# Altium footprint library BARKO_PCBLIB.PcbLib: 531 footprints (part 28 of 34)
Each footprint in its own frame and in the unit in brackets; x right, y up, seen from the top. Pads: shape width x height; smd on the part's side, far side on the other; paste and mask are expansions set on the pad; w line width, h text height; cw(c..) or ccw(c..) is an arc to the next point about the centre after c.
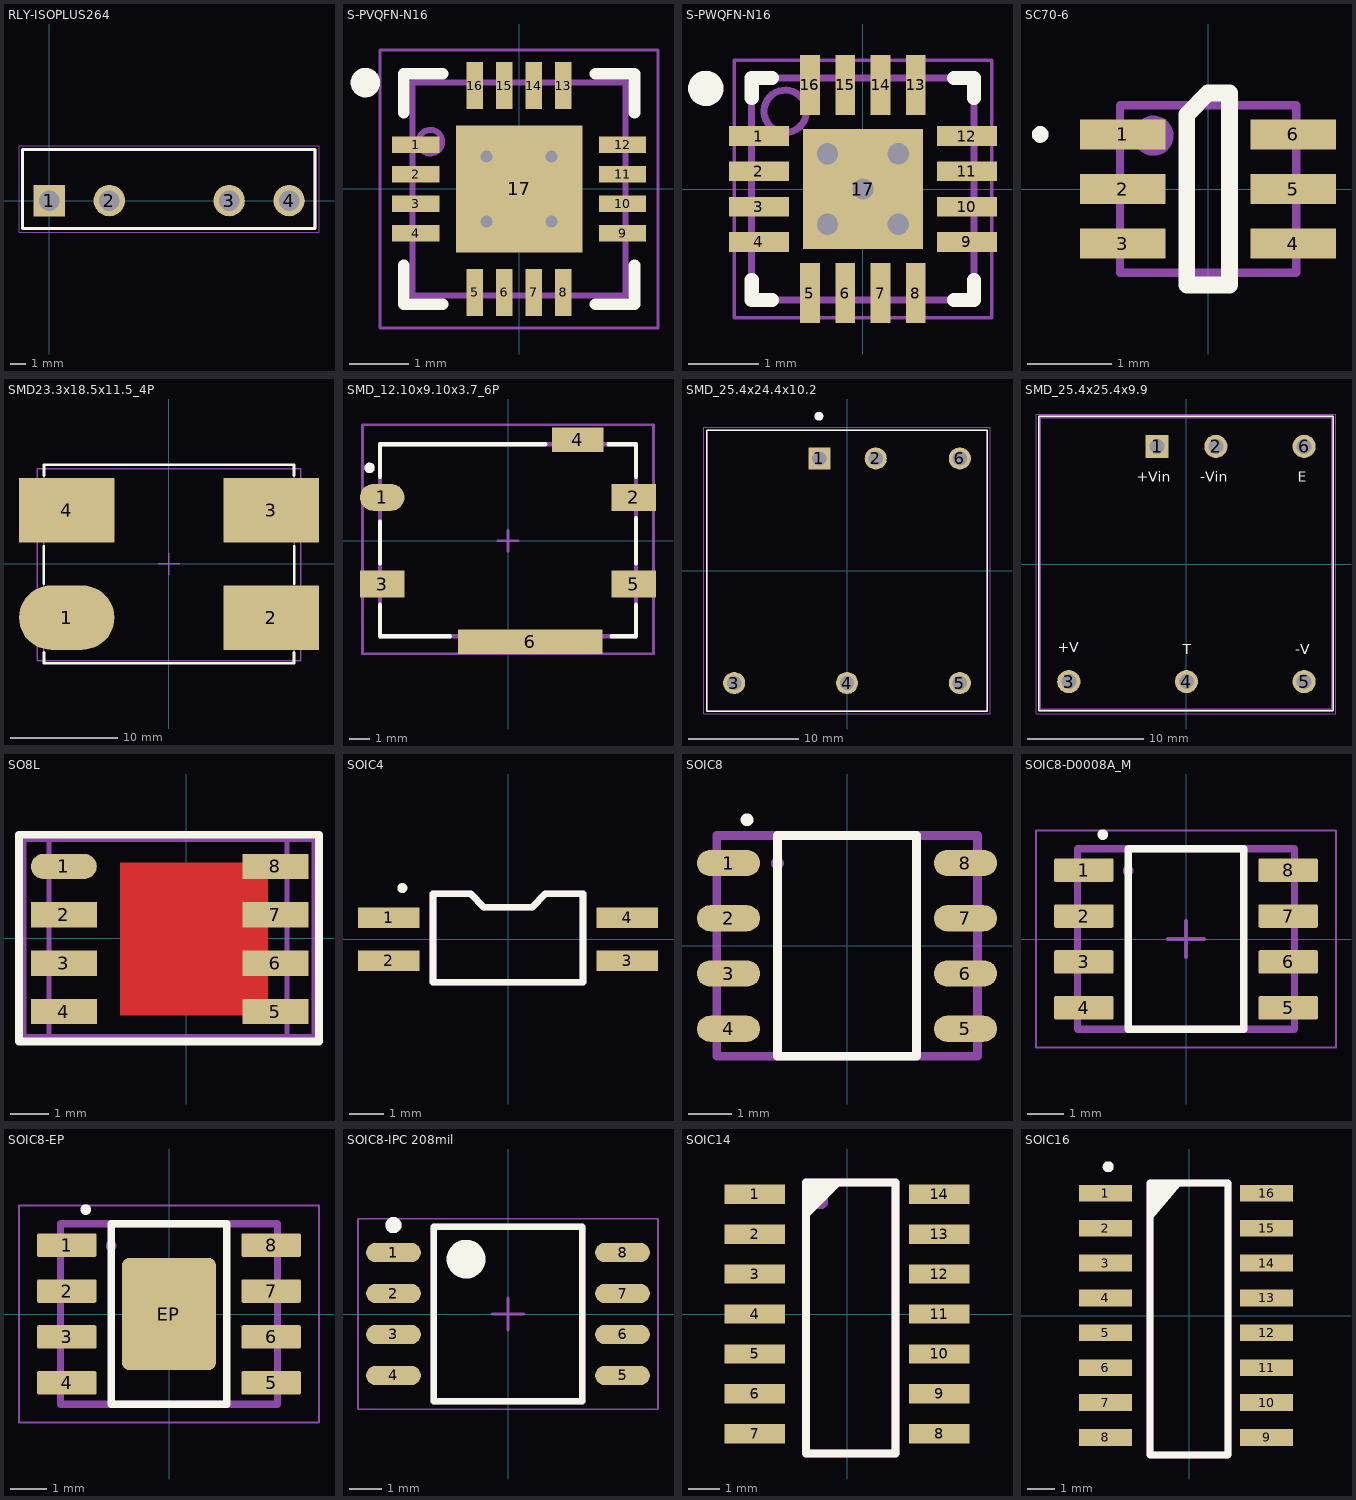
[diagram p27: the footprints below, top view; thin cyan lines are the x and y axes]

## RLY-ISOPLUS264 [mm] "SIL, 4-Leads, Body 21x3.5mm"
height 12.6
pads (4):
  rect 2x2 hole 1.3: 1(0,0)
  round 2 hole 1.3: 2(3.81,0) 3(11.43,0) 4(15.24,0)
Top Overlay:
  lines w0.2: -1.71,-1.778 -1.71,3.247 16.891,3.247 16.891,-1.778 -1.71,-1.778
Mechanical 13:
  lines w0.1: -1.71,-1.778 16.891,-1.778 16.891,3.247 -1.71,3.247 -1.71,-1.778
Mechanical 15:
  lines w0.05: -1.935,-2 -1.935,3.472 17.145,3.472 17.145,-2 -1.935,-2
ASM Top:
  lines w0.2: -1.71,3.247 -1.71,-1.778 16.891,-1.778 16.891,3.247
  text ".designator" at 6.4,0.7 h1.5

## S-PVQFN-N16 [mm] "QFN, 16-Leads, Body 3,50x3,50mm, Pitch 0,50mm, Thermal Pad 2,14x2,14mm, IPC Medium Density"
height 1
pads (17):
  rect 0.8x0.28 smd: 1(-1.75,0.75) 2(-1.75,0.25) 3(-1.75,-0.25) 4(-1.75,-0.75) 9(1.75,-0.75) 10(1.75,-0.25) 11(1.75,0.25) 12(1.75,0.75)
  rect 0.28x0.8 smd: 5(-0.75,-1.75) 6(-0.25,-1.75) 7(0.25,-1.75) 8(0.75,-1.75) 13(0.75,1.75) 14(0.25,1.75) 15(-0.25,1.75) 16(-0.75,1.75)
  rect 2.14x2.14 smd: 17(0,0)
via -0.55,0.55 diameter 0.5 hole 0.2
via 0.55,0.55 diameter 0.5 hole 0.2
via -0.55,-0.55 diameter 0.5 hole 0.2
via 0.55,-0.55 diameter 0.5 hole 0.2
Top Overlay:
  circle w0.25: c-2.6,1.8 r0.125
  lines w0.2: -1.95,-1.29 -1.95,-1.95 -1.29,-1.95 ; -1.95,1.29 -1.95,1.95 -1.29,1.95 ; 1.29,-1.95 1.95,-1.95 1.95,-1.29 ; 1.29,1.95 1.95,1.95 1.95,1.29
Mechanical 15:
  lines w0.05: -2.35,-2.35 -2.35,2.35 2.35,2.35 2.35,-2.35 -2.35,-2.35
  lines w0.1: -0.5,0 0.5,0 ; 0,-0.5 0,0.5
ASM Top:
  circle w0.1: c-1.5,0.8 r0.2
  lines w0.1: -1.8,-1.8 -1.8,1.8 1.8,1.8 1.8,-1.8 -1.8,-1.8
  text ".designator" at -1.5,-0.6 h0.8
3D body "S-PVQFN-N16.step": height 1, standoff 0, extent -1.88,-1.88 1.88,1.88

## S-PWQFN-N16 [mm] "PQFN, 16-Leads, Body 3,00x3,00mm, Pitch 0,50mm, Thermal Pad 1,70x1,70mm, IPC Medium Density"
height 0.8
pads (17):
  rect 0.85x0.28 smd: 1(-1.475,0.75) 2(-1.475,0.25) 3(-1.475,-0.25) 4(-1.475,-0.75) 9(1.475,-0.75) 10(1.475,-0.25) 11(1.475,0.25) 12(1.475,0.75)
  rect 0.28x0.85 smd: 5(-0.75,-1.475) 6(-0.25,-1.475) 7(0.25,-1.475) 8(0.75,-1.475) 13(0.75,1.475) 14(0.25,1.475) 15(-0.25,1.475) 16(-0.75,1.475)
  rect 1.7x1.7 smd: 17(0,0)
via -0.5,0.5 diameter 0.3 hole 0.3
via 0.5,0.5 diameter 0.3 hole 0.3
via 0.5,-0.5 diameter 0.3 hole 0.3
via -0.5,-0.5 diameter 0.3 hole 0.3
via 0,0 diameter 0.3 hole 0.3
Top Overlay:
  circle w0.25: c-2.225,1.425 r0.125
  lines w0.2: -1.575,-1.29 -1.575,-1.575 -1.29,-1.575 ; -1.575,1.29 -1.575,1.575 -1.29,1.575 ; 1.29,-1.575 1.575,-1.575 1.575,-1.29 ; 1.29,1.575 1.575,1.575 1.575,1.29
Mechanical 15:
  lines w0.05: -1.825,-1.825 1.825,-1.825 1.825,1.825 -1.825,1.825 -1.825,-1.825
  lines w0.1: -0.5,0 0.5,0 ; 0,-0.5 0,0.5
ASM Top:
  circle w0.1: c-1.1,1.1 r0.3
  lines w0.1: -1.575,-1.575 1.575,-1.575 1.575,1.575 -1.575,1.575 -1.575,-1.575
  text ".designator" at -1.4,-0.9 h0.8
3D body "S-PWQFN-N16.step": height 0.8, standoff 0, extent -1.575,-1.575 1.575,1.575

## SC70-6 [mil] "SOT23, 6-Leads, Body 2,90x2,80mm, Pitch 0,95mm, IPC Medium Density"
height 39.37
pads (6):
  rect 40x14 smd: 1(-40,25.6) 2(-40,0) 3(-40,-25.6) 4(40,-25.6) 5(40,0) 6(40,25.6)
Top Overlay:
  circle w3.94: c-78.74,25.6 r1.97
  lines w7.87: -10,-44.99 10,-44.99 10,45.01 0,45.01 -10,35.01 -10,-44.99
ASM Top:
  circle w10: c-25.6,25.01 r4.4
  lines w3.94: -41.33,-39.37 41.35,-39.37 41.35,39.37 -41.33,39.37 -41.33,-39.37
  text ".designator" at -3.84,-0.74 h31.5
3D body "SC70-6.step": height 36.42, standoff -0.98, extent -41.33,-39.37 41.34,39.37

## SMD23.3x18.5x11.5_4P [mm] "SMD Common Mode Power Line Choke, 4 leads"
height 11.5
pads (4):
  oval 8.89x6 smd: 1(-9.538,-5)
  rect 8.89x6 smd: 2(9.538,-5) 3(9.538,5) 4(-9.538,5)
Top Overlay:
  lines w0.254: -11.684,-1.849 -11.684,1.651 ; -11.65,-8.25 -11.65,-9.25 11.65,-9.25 ; -11.65,8.25 -11.65,9.25 11.65,9.25 11.65,8.249 ; 11.65,-9.251 11.65,-8.251 ; 11.684,-1.849 11.684,1.651
Mechanical 15:
  lines w0.127: -1,0 1,0 ; 0,-1 0,1 ; -11.684,-9.271 11.684,-9.271 11.684,9.271 -11.684,9.271 -11.684,-9.271
ASM Top:
  lines w0.127: -12.275,-9 -12.275,8.89 12.275,8.89 12.275,-9 -12.275,-9
  text ".designator" at -2.2,-0.2 h0.8
3D body "744663xxx_SH.stp": height 11.05, standoff 0, extent -12.275,-9 12.275,9

## SMD_12.10x9.10x3.7_6P [mm]
pads (6):
  oval 2.159x1.3 smd: 1(-6.096,2.1)
  rect 2.159x1.3 smd: 2(6.096,2.1) 3(-6.096,-2.1) 5(6.096,-2.1)
  rect 2.5x1.2 smd: 4(3.378,4.89)
  rect 7x1.2 smd: 6(1.067,-4.89)
Top Overlay:
  circle w0.3: c-6.706,3.531 r0.1
  lines w0.2: -6.198,-3.097 -6.198,-4.623 -2.81,-4.623 ; -6.198,-1.106 -6.198,0.935 ; -6.198,3.099 -6.198,4.674 1.801,4.674 ; 4.861,4.674 6.198,4.674 6.198,3.099 ; 5.016,-4.623 6.198,-4.623 6.198,-3.097 ; 6.198,-1.106 6.198,-0.916 6.198,1.093
Mechanical 15:
  lines w0.127: -0.5,-0.001 0.5,-0.001 ; 0,-0.501 0,0.499 ; -7.05,-5.475 7.05,-5.475 7.05,5.625 -7.05,5.625 -7.05,-5.475
ASM Top:
  circle w0.3: c-6.706,3.531 r0.1
  lines w0.2: -6.198,-4.623 6.198,-4.623 6.198,4.674 -6.198,4.674 -6.198,-4.623
  text ".designator" at -3.175,-0.162 h0.8
3D body "User Library-BNX024.step": height 3.61, standoff 0.01, extent -6.15,-4.65 6.15,4.65

## SMD_25.4x24.4x10.2 [mm]
pads (6):
  rect 2x2 hole 1.3: 1(-2.5,10.15)
  round 2 hole 1.3: 2(2.6,10.15) 3(-10.2,-10.15) 4(0,-10.15) 5(10.2,-10.15) 6(10.2,10.15)
Top Overlay:
  circle w0.4: c-2.54,13.97 r0.2
  lines w0.127: -12.7,-12.7 12.7,-12.7 12.7,12.7 -12.7,12.7 -12.7,-12.7
Bottom 3D Body:
  circle w0.4: c-2.54,10.16 r0.2
  circle w0.4: c-2.54,10.16 r0.2
  lines w0.127: -12.7,-12.7 -12.7,12.7 ; -12.7,-12.7 12.7,-12.7 ; -12.7,-12.7 -12.7,12.7 ; -12.7,-12.7 12.7,-12.7 ; -12.7,12.7 12.7,12.7 ; -12.7,12.7 12.7,12.7 ; 12.7,-12.7 12.7,12.7 ; 12.7,-12.7 12.7,12.7
Mechanical 16:
  lines w0.05: -12.95,-12.95 12.95,-12.95 12.95,12.95 -12.95,12.95 -12.95,-12.95
3D body "CUI_PDQ30-Q24-S5-D.step": height 10.21, standoff -5.59, extent -12.7,-12.7 12.7,12.7

## SMD_25.4x25.4x9.9 [mm] "THN 30-2415"
height 9.9
pads (6):
  rect 2x2 hole 1.3: 1(-2.54,10.15)
  round 2 hole 1.3: 2(2.54,10.15) 3(-10.16,-10.15) 4(0,-10.15) 5(10.16,-10.15) 6(10.16,10.15)
Top Overlay:
  lines w0.127: -12.74,-12.65 -12.74,12.75 12.66,12.75 12.66,-12.65 -12.74,-12.65
  text "+Vin" at -4.3,6.8 h1.52
  text "-Vin" at 1.2,6.8 h1.52
  text "E" at 9.6,6.8 h1.52
  text "-V" at 9.4,-8.1 h1.52
  text "T" at -0.3,-8.1 h1.52
  text "+V" at -11.1,-7.9 h1.52
Bottom 3D Body:
  circle w0.4: c-2.58,10.16 r0.2
  circle w0.4: c-2.58,10.16 r0.2
Mechanical 16:
  lines w0.05: -12.99,-12.95 -12.99,12.95 12.91,12.95 12.91,-12.95 -12.99,-12.95
ASM Top:
  lines w0.254: -12.7,-12.6 12.6,-12.6 12.6,12.7 -12.7,12.7 -12.7,-12.6
  text ".designator" at -3.075,-0.262 h0.8
3D body "thn30_3d_drawing.stp": height 11.4, standoff -4.3, extent -12.74,-12.7 12.66,12.7

## SO8L [mm]
pads (8):
  oval 1.7x0.65 smd: 1(-3.159,1.852)
  rect 1.7x0.65 smd: 2(-3.159,0.602) 3(-3.159,-0.648) 4(-3.159,-1.898) 5(2.306,-1.898) 6(2.306,-0.648) 7(2.306,0.602) 8(2.306,1.852)
Top Layer:
  region: -1.699,1.947 2.111,1.947 2.111,-1.993 -1.699,-1.993
Top Overlay:
  lines w0.2: -4.318,-2.667 3.429,-2.667 3.429,2.667 -4.318,2.667 -4.318,-2.667
Mechanical 15:
  lines w0.127: -0.495,0.001 0.504,0.001 ; 0.005,-0.499 0.005,0.501 ; -4.191,-2.54 -4.191,2.551 3.302,2.551 3.302,-2.54 -4.191,-2.54
ASM Top:
  circle w0.254: c-2.825,1.9 r0.112
  lines w0.127: -3.548,-2.599 2.602,-2.599 2.602,2.551 -3.548,2.551 -3.548,-2.599
  text ".designator" at -1.5,-0.3 h0.8
3D body "User Library-PowerPAK SO-8 (S).step": height 1.04, standoff 0, extent -3.548,-2.599 2.602,2.551

## SOIC4 [mm]
pads (4):
  rect 1.8x0.6 smd: 1(-3.5,0.635) 2(-3.5,-0.635) 3(3.5,-0.635) 4(3.5,0.635)
Top Overlay:
  circle w0.2: c-3.1,1.5 r0.047
  lines w0.2: -2.2,-1.265 2.2,-1.265 2.2,1.335 1.1,1.335 0.7,0.935 -0.7,0.935 -1.1,1.335 -2.2,1.335 -2.2,-1.265
ASM Top:
  lines w0.2: -2.2,-1.265 -2.2,1.335 -1.1,1.335 -0.7,0.935 0.7,0.935 1.1,1.335 2.2,1.335 2.2,-1.265 -2.2,-1.265
  text ".designator" at -0.4,-0.1 h0.8
3D body "User Library-ACPL-217-56DE.step": height 2.01, standoff -0.12, extent -3.5,-1.3 3.5,1.3

## SOIC8 [mm]
pads (8):
  oval 1.45x0.6 smd: 1(-2.725,1.905) 2(-2.725,0.635) 3(-2.725,-0.635) 4(-2.725,-1.905) 5(2.725,-1.905) 6(2.725,-0.635) 7(2.725,0.635) 8(2.725,1.905)
Top Overlay:
  circle w0.2: c-2.3,2.9 r0.047
  lines w0.203: -1.6,-2.54 1.6,-2.54 1.6,2.54 -1.6,2.54 -1.6,-2.54
ASM Top:
  circle w0.2: c-1.6,1.905 r0.047
  lines w0.203: -2.997,-2.54 3,-2.54 3,2.54 -2.997,2.54 -2.997,-2.54
  text ".designator" at -0.5,-0.2 h0.8
3D body "SOIC-8-1.STEP": height 1.75, standoff 0, extent -2.997,-2.438 3.003,2.462

## SOIC8-D0008A_M [mm] "SOIC, 8-Leads, Body 5x4mm, Pitch 1.27mm, IPC Low Density"
height 1.75
pads (8):
  rrect15% 1.65x0.65 smd: 1(-2.825,1.905) 2(-2.825,0.635) 3(-2.825,-0.635) 4(-2.825,-1.905) 5(2.825,-1.905) 6(2.825,-0.635) 7(2.825,0.635) 8(2.825,1.905)
Top Overlay:
  circle w0.2: c-2.303,2.888 r0.047
  lines w0.2: -1.6,-2.5 1.6,-2.5 1.6,2.5 -1.6,2.5 -1.6,-2.5
Mechanical 15:
  lines w0.05: -4.15,-3 4.15,-3 4.15,3 -4.15,3 -4.15,-3
  lines w0.1: -0.5,0 0.5,0 ; 0,-0.5 0,0.5
ASM Top:
  circle w0.2: c-1.603,1.893 r0.047
  lines w0.2: -3,-2.5 -3,2.5 3,2.5 3,-2.5 -3,-2.5
  text ".designator" at -0.69,-0.2 h0.8
3D body "SOIC-8akaD0008AakaM08A.stp": height 1.63, standoff 0, extent -3,-2.45 3,2.45

## SOIC8-EP [mm] "SOIC, 8-Leads, Body 5x4mm, Pitch 1.27mm, IPC Low Density"
height 1.75
pads (9):
  rrect15% 1.65x0.65 smd: 1(-2.825,1.905) 2(-2.825,0.635) 3(-2.825,-0.635) 4(-2.825,-1.905) 5(2.825,-1.905) 6(2.825,-0.635) 7(2.825,0.635) 8(2.825,1.905)
  rrect15% 2.6x3.1 smd paste-6: EP(0,0)
Top Overlay:
  circle w0.2: c-2.303,2.888 r0.047
  lines w0.2: -1.6,-2.5 1.6,-2.5 1.6,2.5 -1.6,2.5 -1.6,-2.5
Top Paste:
  rectangle: -1.2,-1.5 -0.4,-0.3
  region: 1.2,1.5 0.4,1.5 0.4,0.3 1.2,0.3
  region: 1.2,-0.3 0.4,-0.3 0.4,-1.5 1.2,-1.5
  rectangle: -1.2,0.3 -0.4,1.5
Mechanical 15:
  lines w0.05: -4.15,-3 4.15,-3 4.15,3 -4.15,3 -4.15,-3
  lines w0.1: -0.5,0 0.5,0 ; 0,-0.5 0,0.5
ASM Top:
  circle w0.2: c-1.603,1.893 r0.047
  lines w0.2: -3,-2.5 -3,2.5 3,2.5 3,-2.5 -3,-2.5
  text ".designator" at -0.69,-0.2 h0.8
3D body "SOIC-8akaD0008AakaM08A.stp": height 1.63, standoff 0, extent -3,-2.45 3,2.45

## SOIC8-IPC 208mil [mm] "SOIC, 8-Leads, Body 5.28x5.28mm, Pitch 1.27mm, IPC Medium Density"
height 2.16
pads (8):
  oval 1.7x0.6 smd: 1(-3.55,1.905) 2(-3.55,0.635) 3(-3.55,-0.635) 4(-3.55,-1.905) 5(3.55,-1.905) 6(3.55,-0.635) 7(3.55,0.635) 8(3.55,1.905)
Top Overlay:
  circle w0.6: c-1.3,1.7 r0.3
  circle w0.25: c-3.55,2.755 r0.125
  lines w0.2: -2.3,-2.7 2.3,-2.7 2.3,2.7 -2.3,2.7 -2.3,-2.7
Mechanical 15:
  lines w0.05: -4.65,-2.95 4.65,-2.95 4.65,2.95 -4.65,2.95 -4.65,-2.95
  lines w0.1: -0.5,0 0.5,0 ; 0,-0.5 0,0.5
ASM Top:
  circle w0.25: c-3.55,2.755 r0.125
  lines w0.2: -2.3,-2.7 -2.3,2.7 2.3,2.7 2.3,-2.7 -2.3,-2.7
  text ".designator" at -1.1,0 h0.8
3D body "User Library-SOIC-8-208.STEP": height 2.16, standoff 0.01, extent -4.1,-2.7 4.1,2.7

## SOIC14 [mil]
pads (14):
  rect 76x24 smd mask+2: 1(-115.5,150) 2(-115.5,100) 3(-115.5,50) 4(-115.5,0) 5(-115.5,-50) 6(-115.5,-100) 7(-115.5,-150) 8(115.5,-150) 9(115.5,-100) 10(115.5,-50) 11(115.5,0) 12(115.5,50) 13(115.5,100) 14(115.5,150)
Top Overlay:
  region: -51.5,118 -51.5,165 -4.5,165
  lines w10: -51.5,-175 -51.5,165 60.5,165 60.5,-175 -51.5,-175
ASM Top:
  circle w10: c-33,141 r4.47
  lines w10: -51.5,-175 60.5,-175 60.5,165 -51.5,165 -51.5,-175
  text ".designator" at 2.6,0 h31.5
3D body "SOIC-14.STEP": height 68.9, standoff 0, extent -115.5,-172 120.72,172.48

## SOIC16 [mil]
pads (16):
  rect 76x24 smd mask+2: 1(-120.1,175.79) 2(-120.1,125.79) 3(-120.1,75.79) 4(-120.1,25.79) 5(-120.1,-24.21) 6(-120.1,-74.21) 7(-120.1,-124.21) 8(-120.1,-174.21) 9(110.9,-174.21) 10(110.9,-124.21) 11(110.9,-74.21) 12(110.9,-24.21) 13(110.9,25.79) 14(110.9,75.79) 15(110.9,125.79) 16(110.9,175.79)
Top Overlay:
  circle w7.87: c-116.1,213.79 r3.94
  region: -56.1,135.79 -56.1,190.79 -9.1,190.79
  lines w10: -56.1,-199.21 55.9,-199.21 55.9,190.79 -56.1,190.79 -56.1,-199.21
ASM Top:
  circle w10: c-39,170 r4.47
  lines w10: -56.1,-199.21 55.9,-199.21 55.9,190.79 -56.1,190.79 -56.1,-199.21
  text ".designator" at -19.68,-15.75 h31.5
3D body "SOIC-16_3.9x9.9mm_Pitch1.27mm.step": height 69.4, standoff 0.5, extent -118.1,-194.88 118.11,194.88